# Altium footprint library LUMI_Standard_Auto_Soldering_LIB.PcbLib: 344 footprints (part 18 of 22)
Each footprint in its own frame and in the unit in brackets; x right, y up, seen from the top. Pads: shape width x height; smd on the part's side, far side on the other; paste and mask are expansions set on the pad; w line width, h text height; cw(c..) or ccw(c..) is an arc to the next point about the centre after c.
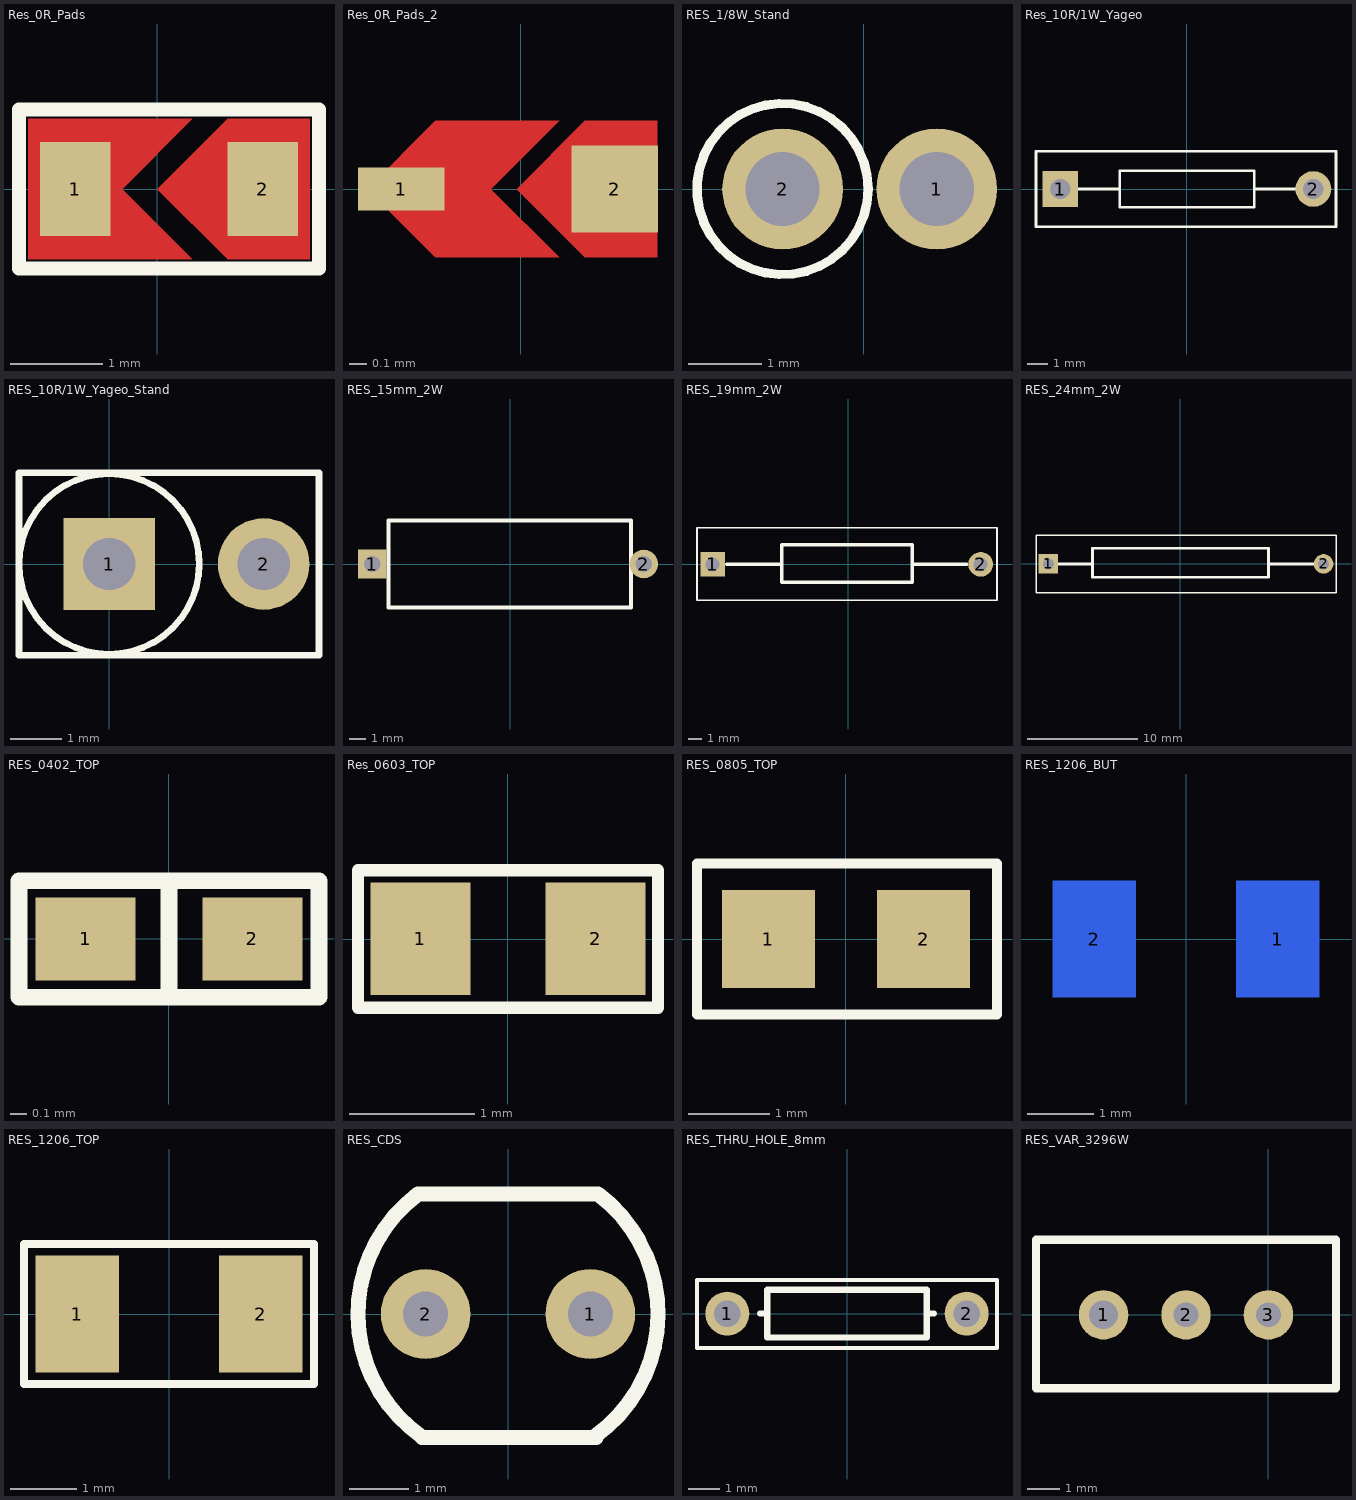
[diagram p17: the footprints below, top view; thin cyan lines are the x and y axes]

## Res_0R_Pads [mil]
pads (2):
  rect 30x40 smd: 1(-35,0) 2(45,0)
Top Layer:
  region: 30,30 0,0 30,-30 65,-30 65,30
  region: -55,30 15,30 -15,0 15,-30 -55,-30
Top Overlay:
  lines w6: -59,-34 -59,34 69,34 69,-34 -59,-34
Top Solder:
  region: -55,30 15,30 -15,0 15,-30 -55,-30
  region: 30,30 0,0 30,-30 65,-30 65,30

## Res_0R_Pads_2 [mil]
pads (2):
  rect 20x10 smd: 1(-27.56,0)
  rect 20x20 smd: 2(21.65,0)
Top Layer:
  region: -19.68,15.75 8.86,15.75 -6.89,0 8.86,-15.75 -19.68,-15.75 -35.43,0
  region: 14.76,15.75 -0.98,0 14.76,-15.75 31.5,-15.75 31.5,15.75
Top Solder:
  region: 15.75,15.75 0,0 15.75,-15.75 31.5,-15.75 31.5,15.75
  region: -35.43,15.75 15.75,15.75 0,0 15.75,-15.75 -35.43,-15.75

## RES_1/8W_Stand [mil] "Axial Device, Thru-Hole; 2 Leads; 0.3 in Pin Spacing"
height 60
pads (2):
  round 65 hole 40: 1(39.37,0) 2(-43.62,0)
Top Overlay:
  circle w5: c-43.62,0 r46.1
3D body: height 368, standoff -45, extent -89.62,-46 86.38,46

## Res_10R/1W_Yageo [mil]
pads (2):
  rect 70x70 hole 40: 1(-248.03,0)
  round 70 hole 40: 2(248.03,0)
Top Overlay:
  lines w5: -248.03,0 -130.91,0 ; 131.89,0 248.03,0 ; -295.28,-73.82 -295.28,73.82 292.32,73.82 292.32,-73.82 -295.28,-73.82 ; -130.91,-35.43 131.89,-35.43 131.89,35.43 -130.91,35.43 -130.91,-35.43
3D body: height 137.8, standoff -118.11, extent -258.66,-68.89 262.6,68.9

## RES_10R/1W_Yageo_Stand [mil]
pads (2):
  rect 70x70 hole 40: 1(0,0)
  round 70 hole 40: 2(118.11,0)
Top Overlay:
  circle w5: c0,0 r68.9
  lines w5: -68.9,-69.88 -68.9,69.88 160.43,69.88 160.43,-69.88 0,-69.88 -68.9,-69.88

## RES_15mm_2W [mil]
pads (2):
  rect 70x70 hole 40: 1(-338.58,0)
  round 70 hole 40: 2(326.77,0)
Top Overlay:
  lines w10: -299.21,-106.3 -299.21,106.3 295.28,106.3 295.28,-106.3 -299.21,-106.3
3D body: height 137.76, standoff 98.46, extent 169.29,-19.69 326.77,19.52
3D body: height 137.76, standoff 98.46, extent -338.58,-19.52 -181.1,19.69
3D body: height 118.11, standoff -39.37, extent 307.13,-19.52 346.42,19.69
3D body: height 118.11, standoff -39.37, extent -358.23,-19.52 -318.94,19.69
3D body: height 196.66, standoff 0.19, extent -295.28,-97.64 295.27,98.43

## RES_19mm_2W [mil]
pads (2):
  rect 70x70 hole 40: 1(-383.86,0)
  round 70 hole 40: 2(374.02,0)
Top Overlay:
  lines w5: -428.15,-101.38 -428.15,103.35 420.28,103.35 420.28,-101.38 -428.15,-101.38
  lines w10: -344.49,0 -188.98,0 ; 180.12,0 334.65,0 ; -188.98,-51.18 181.1,-51.18 181.1,55.12 -188.98,55.12 -188.98,-51.18
3D body: height 198.43, standoff -116.54, extent -365.75,-98.42 365.75,98.43

## RES_24mm_2W [mil] "Axial Device, Thru-Hole; 2 Leads; 0.3 in Pin Spacing"
height 60
pads (2):
  rect 70x70 hole 40: 1(-472.44,0)
  round 70 hole 40: 2(511.81,0)
Top Overlay:
  lines w5: -516.73,-103.35 -516.73,102.36 556.1,102.36 556.1,-103.35 -455.71,-103.35 -516.73,-103.35
  lines w10: -472.44,0 -314.96,0 ; 314.96,0 511.81,0 ; -314.96,-48.23 314.96,-48.23 314.96,56.1 -314.96,56.1 -314.96,-48.23
3D body: height 348.43, standoff 33.46, extent -365.75,-98.42 365.75,98.43

## RES_0402_TOP [mm]
pads (2):
  rect 0.6x0.5 smd: 1(-0.5,0) 2(0.5,0)
Top Overlay:
  lines w0.1: 0,-0.3 0,0.3 ; -0.9,-0.35 0.9,-0.35 0.9,0.35 -0.9,0.35 -0.9,-0.35
3D body: height 0.41, standoff 0, extent -0.575,-0.275 0.575,0.275

## Res_0603_TOP [mm]
pads (2):
  rect 0.8x0.9 smd: 1(-0.7,0) 2(0.7,0)
Top Overlay:
  lines w0.1: -1.2,-0.55 -1.2,0.55 1.2,0.55 1.2,-0.55 -1.2,-0.55
3D body: height 0.3, standoff 0, extent -0.8,-0.4 0.8,0.4

## RES_0805_TOP [mm]
pads (2):
  rect 1.14x1.2 smd: 1(-0.95,0) 2(0.95,0)
Top Overlay:
  lines w0.127: -1.825,-0.925 -1.825,0.925 1.85,0.925 1.85,-0.925 -1.825,-0.925
3D body: height 0.5, standoff 0, extent -1,-0.625 1,0.625

## RES_1206_BUT [mm]
pads (2):
  rect 1.25x1.75 smd far side: 1(1.375,0) 2(-1.375,0)
Bottom Overlay:
  lines w0.127: -2.175,-1.05 -2.175,1.05 2.175,1.05 2.175,-1.05 -2.175,-1.05
3D body: height -0.41, standoff -0.96, extent -1.473,-0.8 1.727,0.8

## RES_1206_TOP [mm]
pads (2):
  rect 1.25x1.75 smd: 1(-1.375,0) 2(1.375,0)
Top Overlay:
  lines w0.127: -2.175,-1.05 2.175,-1.05 2.175,1.05 -2.175,1.05 -2.175,-1.05
3D body: height -0.41, standoff -0.96, extent -1.727,-0.8 1.473,0.8

## RES_CDS [mil]
pads (2):
  round 60 hole 30: 1(55.12,0) 2(-55.12,0)
Top Overlay:
  lines w10: -57.56,-82.79 59.06,-82.79 ; -57.56,-82.23 cw(c0,0) -60.22,80.3 60.22,80.3 cw(c0,0) 58.29,-81.71
3D body: height 160, standoff -1330, extent -91,-75.26 91,78.74

## RES_THRU_HOLE_8mm [mm] "Axial Device, Thru-Hole; 2 Leads; 0.3 in Pin Spacing"
height 1.524
pads (2):
  round 1.4 hole 0.85: 1(-3.81,0) 2(3.81,0)
Top Overlay:
  lines w0.127: -4.775,-1.1 4.775,-1.1 4.775,1.075 -4.775,1.075 -4.775,-1.1
  lines w0.2: -2.769,0 -2.54,0 ; 2.769,0 2.54,0 ; 2.54,0 2.54,-0.762 -2.54,-0.762 -2.54,0.762 2.54,0.762 2.54,0
3D body: height 2.09, standoff -1.91, extent -4.075,-1 4.025,1

## RES_VAR_3296W [mil]
pads (3):
  round 60 hole 35: 1(-200,0)
  round 60 hole 30: 2(-100,0) 3(0,0)
Top Overlay:
  lines w10: -282,-89 -282,91 82,91 82,-89 -282,-89
3D body: height 475.51, standoff -213.47, extent -281.1,-93 81.1,95.98